# Altium footprint library 1.27插件排母.PcbLib: 33 footprints (part 1 of 3)
Each footprint in its own frame and in the unit in brackets; x right, y up, seen from the top. Pads: shape width x height; smd on the part's side, far side on the other; paste and mask are expansions set on the pad; w line width, h text height; cw(c..) or ccw(c..) is an arc to the next point about the centre after c.
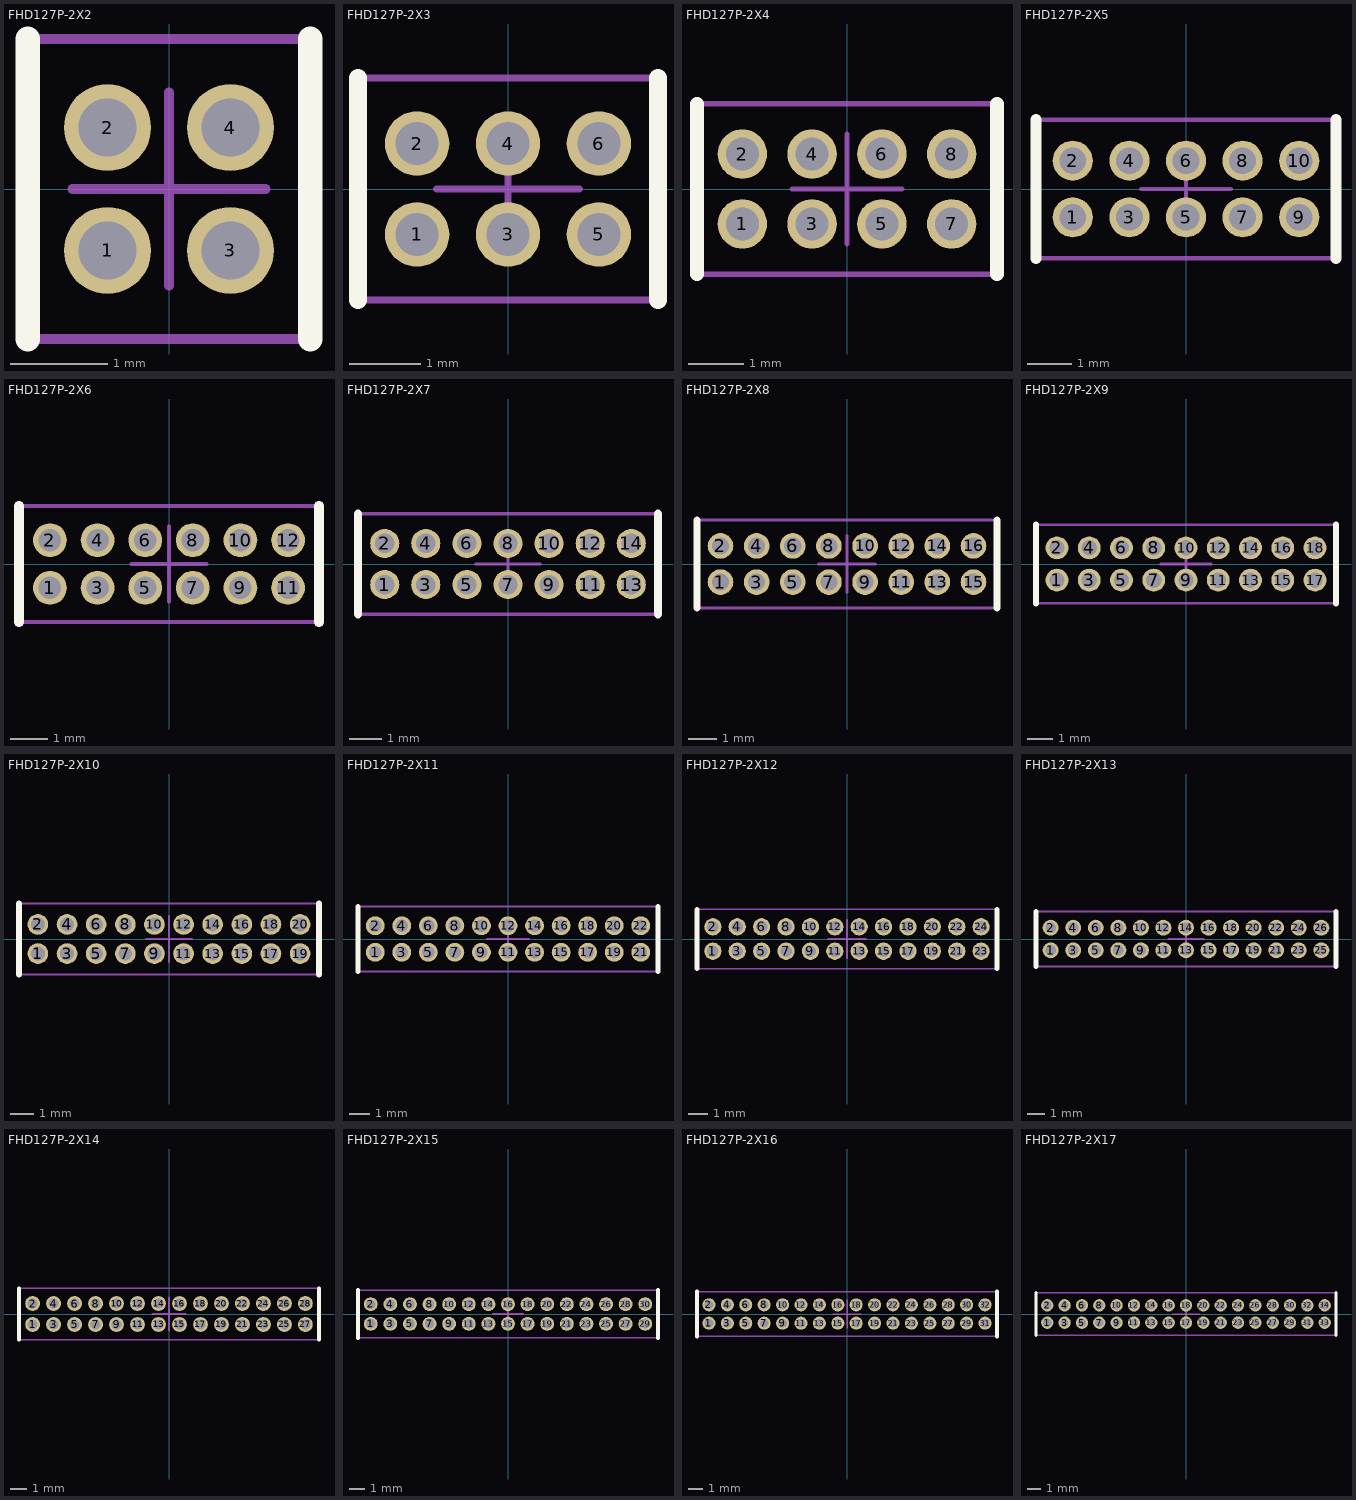
[diagram p0: the footprints below, top view; thin cyan lines are the x and y axes]

## FHD127P-2X2 [mm] "1.27mm脚距 插件 双排母"
height 3.4
pads (4):
  round 0.9 hole 0.6: 1(-0.635,-0.635) 2(-0.635,0.635) 3(0.635,-0.635) 4(0.635,0.635)
Top Overlay:
  lines w0.254: -1.46,-1.55 -1.46,1.55 ; 1.46,-1.55 1.46,1.55
Mechanical 13:
  lines w0.1: -1.46,-1.55 -1.46,1.55 1.46,1.55 1.46,-1.55 -1.46,-1.55
Mechanical 15:
  lines w0.1: -1,0 1,0 ; 0,-1 0,1
3D body: height 3.4, standoff -2.4, extent -1.46,-1.499 1.46,1.501

## FHD127P-2X3 [mm] "1.27mm脚距 插件 双排母"
height 3.4
pads (6):
  round 0.9 hole 0.6: 1(-1.27,-0.635) 2(-1.27,0.635) 3(0,-0.635) 4(0,0.635) 5(1.27,-0.635) 6(1.27,0.635)
Top Overlay:
  lines w0.254: -2.095,-1.55 -2.095,1.55 ; 2.095,-1.55 2.095,1.55
Mechanical 13:
  lines w0.1: -2.095,-1.55 -2.095,1.55 2.095,1.55 2.095,-1.55 -2.095,-1.55
Mechanical 15:
  lines w0.1: -1,0 1,0 ; 0,-1 0,1
3D body: height 3.4, standoff -2.4, extent -2.095,-1.499 2.095,1.501

## FHD127P-2X4 [mm] "1.27mm脚距 插件 双排母"
height 3.4
pads (8):
  round 0.9 hole 0.6: 1(-1.905,-0.635) 2(-1.905,0.635) 3(-0.635,-0.635) 4(-0.635,0.635) 5(0.635,-0.635) 6(0.635,0.635) 7(1.905,-0.635) 8(1.905,0.635)
Top Overlay:
  lines w0.254: -2.73,-1.55 -2.73,1.55 ; 2.73,-1.55 2.73,1.55
Mechanical 13:
  lines w0.1: -2.73,-1.55 -2.73,1.55 2.73,1.55 2.73,-1.55 -2.73,-1.55
Mechanical 15:
  lines w0.1: -1,0 1,0 ; 0,-1 0,1
3D body: height 3.4, standoff -2.4, extent -2.73,-1.499 2.73,1.501

## FHD127P-2X5 [mm] "1.27mm脚距 插件 双排母"
height 3.4
pads (10):
  round 0.9 hole 0.6: 1(-2.54,-0.635) 2(-2.54,0.635) 3(-1.27,-0.635) 4(-1.27,0.635) 5(0,-0.635) 6(0,0.635) 7(1.27,-0.635) 8(1.27,0.635) 9(2.54,-0.635) 10(2.54,0.635)
Top Overlay:
  lines w0.254: -3.365,-1.55 -3.365,1.55 ; 3.365,-1.55 3.365,1.55
Mechanical 13:
  lines w0.1: -3.365,-1.55 3.365,-1.55 3.365,1.55 -3.365,1.55 -3.365,-1.55
Mechanical 15:
  lines w0.1: -1,0 1,0 ; 0,-1 0,1
3D body: height 3.4, standoff -2.4, extent -3.365,-1.499 3.365,1.501

## FHD127P-2X6 [mm] "1.27mm脚距 插件 双排母"
height 3.4
pads (12):
  round 0.9 hole 0.6: 1(-3.175,-0.635) 2(-3.175,0.635) 3(-1.905,-0.635) 4(-1.905,0.635) 5(-0.635,-0.635) 6(-0.635,0.635) 7(0.635,-0.635) 8(0.635,0.635) 9(1.905,-0.635) 10(1.905,0.635) 11(3.175,-0.635) 12(3.175,0.635)
Top Overlay:
  lines w0.254: -4,-1.55 -4,1.55 ; 4,-1.55 4,1.55
Mechanical 13:
  lines w0.1: -4,-1.55 4,-1.55 4,1.55 -4,1.55 -4,-1.55
Mechanical 15:
  lines w0.1: -1,0 1,0 ; 0,-1 0,1
3D body: height 3.4, standoff -2.4, extent -4,-1.499 4,1.501

## FHD127P-2X7 [mm] "1.27mm脚距 插件 双排母"
height 3.4
pads (14):
  round 0.9 hole 0.6: 1(-3.81,-0.635) 2(-3.81,0.635) 3(-2.54,-0.635) 4(-2.54,0.635) 5(-1.27,-0.635) 6(-1.27,0.635) 7(0,-0.635) 8(0,0.635) 9(1.27,-0.635) 10(1.27,0.635) 11(2.54,-0.635) 12(2.54,0.635) 13(3.81,-0.635) 14(3.81,0.635)
Top Overlay:
  lines w0.254: -4.635,-1.55 -4.635,1.55 ; 4.635,-1.55 4.635,1.55
Mechanical 13:
  lines w0.1: -4.635,-1.55 -4.635,1.55 4.635,1.55 4.635,-1.55 -4.635,-1.55
Mechanical 15:
  lines w0.1: -1,0 1,0 ; 0,-1 0,1
3D body: height 3.4, standoff -2.4, extent -4.635,-1.499 4.635,1.501

## FHD127P-2X8 [mm] "1.27mm脚距 插件 双排母"
height 3.4
pads (16):
  round 0.9 hole 0.6: 1(-4.445,-0.635) 2(-4.445,0.635) 3(-3.175,-0.635) 4(-3.175,0.635) 5(-1.905,-0.635) 6(-1.905,0.635) 7(-0.635,-0.635) 8(-0.635,0.635) 9(0.635,-0.635) 10(0.635,0.635) 11(1.905,-0.635) 12(1.905,0.635) 13(3.175,-0.635) 14(3.175,0.635) 15(4.445,-0.635) 16(4.445,0.635)
Top Overlay:
  lines w0.254: -5.27,-1.55 -5.27,1.55 ; 5.27,-1.55 5.27,1.55
Mechanical 13:
  lines w0.1: -5.27,-1.55 5.27,-1.55 5.27,1.55 -5.27,1.55 -5.27,-1.55
Mechanical 15:
  lines w0.1: -1,0 1,0 ; 0,-1 0,1
3D body: height 3.4, standoff -2.4, extent -5.27,-1.499 5.27,1.501

## FHD127P-2X9 [mm] "1.27mm脚距 插件 双排母"
height 3.4
pads (18):
  round 0.9 hole 0.6: 1(-5.08,-0.635) 2(-5.08,0.635) 3(-3.81,-0.635) 4(-3.81,0.635) 5(-2.54,-0.635) 6(-2.54,0.635) 7(-1.27,-0.635) 8(-1.27,0.635) 9(0,-0.635) 10(0,0.635) 11(1.27,-0.635) 12(1.27,0.635) 13(2.54,-0.635) 14(2.54,0.635) 15(3.81,-0.635) 16(3.81,0.635) 17(5.08,-0.635) 18(5.08,0.635)
Top Overlay:
  lines w0.254: -5.905,-1.55 -5.905,1.55 ; 5.905,-1.55 5.905,1.55
Mechanical 13:
  lines w0.1: -5.905,-1.55 5.905,-1.55 5.905,1.55 -5.905,1.55 -5.905,-1.55
Mechanical 15:
  lines w0.1: -1,0 1,0 ; 0,-1 0,1
3D body: height 3.4, standoff -2.4, extent -5.905,-1.499 5.905,1.501

## FHD127P-2X10 [mm] "1.27mm脚距 插件 双排母"
height 3.4
pads (20):
  round 0.9 hole 0.6: 1(-5.715,-0.635) 2(-5.715,0.635) 3(-4.445,-0.635) 4(-4.445,0.635) 5(-3.175,-0.635) 6(-3.175,0.635) 7(-1.905,-0.635) 8(-1.905,0.635) 9(-0.635,-0.635) 10(-0.635,0.635) 11(0.635,-0.635) 12(0.635,0.635) 13(1.905,-0.635) 14(1.905,0.635) 15(3.175,-0.635) 16(3.175,0.635) 17(4.445,-0.635) 18(4.445,0.635) 19(5.715,-0.635) 20(5.715,0.635)
Top Overlay:
  lines w0.254: -6.54,-1.55 -6.54,1.55 ; 6.54,-1.55 6.54,1.55
Mechanical 13:
  lines w0.1: -6.54,-1.55 -6.54,1.55 6.54,1.55 6.54,-1.55 -6.54,-1.55
Mechanical 15:
  lines w0.1: -1,0 1,0 ; 0,-1 0,1
3D body: height 3.4, standoff -2.4, extent -6.54,-1.499 6.54,1.501

## FHD127P-2X11 [mm] "1.27mm脚距 插件 双排母"
height 3.4
pads (22):
  round 0.9 hole 0.6: 1(-6.35,-0.635) 2(-6.35,0.635) 3(-5.08,-0.635) 4(-5.08,0.635) 5(-3.81,-0.635) 6(-3.81,0.635) 7(-2.54,-0.635) 8(-2.54,0.635) 9(-1.27,-0.635) 10(-1.27,0.635) 11(0,-0.635) 12(0,0.635) 13(1.27,-0.635) 14(1.27,0.635) 15(2.54,-0.635) 16(2.54,0.635) 17(3.81,-0.635) 18(3.81,0.635) 19(5.08,-0.635) 20(5.08,0.635) 21(6.35,-0.635) 22(6.35,0.635)
Top Overlay:
  lines w0.254: -7.175,-1.55 -7.175,1.55 ; 7.175,-1.55 7.175,1.55
Mechanical 13:
  lines w0.1: -7.175,-1.55 7.175,-1.55 7.175,1.55 -7.175,1.55 -7.175,-1.55
Mechanical 15:
  lines w0.1: -1,0 1,0 ; 0,-1 0,1
3D body: height 3.4, standoff -2.4, extent -7.175,-1.499 7.175,1.501

## FHD127P-2X12 [mm] "1.27mm脚距 插件 双排母"
height 3.4
pads (24):
  round 0.9 hole 0.6: 1(-6.985,-0.635) 2(-6.985,0.635) 3(-5.715,-0.635) 4(-5.715,0.635) 5(-4.445,-0.635) 6(-4.445,0.635) 7(-3.175,-0.635) 8(-3.175,0.635) 9(-1.905,-0.635) 10(-1.905,0.635) 11(-0.635,-0.635) 12(-0.635,0.635) 13(0.635,-0.635) 14(0.635,0.635) 15(1.905,-0.635) 16(1.905,0.635) 17(3.175,-0.635) 18(3.175,0.635) 19(4.445,-0.635) 20(4.445,0.635) 21(5.715,-0.635) 22(5.715,0.635) 23(6.985,-0.635) 24(6.985,0.635)
Top Overlay:
  lines w0.254: -7.81,-1.55 -7.81,1.55 ; 7.81,-1.55 7.81,1.55
Mechanical 13:
  lines w0.1: -7.81,-1.55 7.81,-1.55 7.81,1.55 -7.81,1.55 -7.81,-1.55
Mechanical 15:
  lines w0.1: -1,0 1,0 ; 0,-1 0,1
3D body: height 3.4, standoff -2.4, extent -7.81,-1.499 7.81,1.501

## FHD127P-2X13 [mm] "1.27mm脚距 插件 双排母"
height 3.4
pads (26):
  round 0.9 hole 0.6: 1(-7.62,-0.635) 2(-7.62,0.635) 3(-6.35,-0.635) 4(-6.35,0.635) 5(-5.08,-0.635) 6(-5.08,0.635) 7(-3.81,-0.635) 8(-3.81,0.635) 9(-2.54,-0.635) 10(-2.54,0.635) 11(-1.27,-0.635) 12(-1.27,0.635) 13(0,-0.635) 14(0,0.635) 15(1.27,-0.635) 16(1.27,0.635) 17(2.54,-0.635) 18(2.54,0.635) 19(3.81,-0.635) 20(3.81,0.635) 21(5.08,-0.635) 22(5.08,0.635) 23(6.35,-0.635) 24(6.35,0.635) 25(7.62,-0.635) 26(7.62,0.635)
Top Overlay:
  lines w0.254: -8.445,-1.55 -8.445,1.55 ; 8.445,-1.55 8.445,1.55
Mechanical 13:
  lines w0.1: -8.445,-1.55 8.445,-1.55 8.445,1.55 -8.445,1.55 -8.445,-1.55
Mechanical 15:
  lines w0.1: -1,0 1,0 ; 0,-1 0,1
3D body: height 3.4, standoff -2.4, extent -8.445,-1.499 8.445,1.501

## FHD127P-2X14 [mm] "1.27mm脚距 插件 双排母"
height 3.4
pads (28):
  round 0.9 hole 0.6: 1(-8.255,-0.635) 2(-8.255,0.635) 3(-6.985,-0.635) 4(-6.985,0.635) 5(-5.715,-0.635) 6(-5.715,0.635) 7(-4.445,-0.635) 8(-4.445,0.635) 9(-3.175,-0.635) 10(-3.175,0.635) 11(-1.905,-0.635) 12(-1.905,0.635) 13(-0.635,-0.635) 14(-0.635,0.635) 15(0.635,-0.635) 16(0.635,0.635) 17(1.905,-0.635) 18(1.905,0.635) 19(3.175,-0.635) 20(3.175,0.635) 21(4.445,-0.635) 22(4.445,0.635) 23(5.715,-0.635) 24(5.715,0.635) 25(6.985,-0.635) 26(6.985,0.635) 27(8.255,-0.635) 28(8.255,0.635)
Top Overlay:
  lines w0.254: -9.08,-1.55 -9.08,1.55 ; 9.08,-1.55 9.08,1.55
Mechanical 13:
  lines w0.1: -9.08,-1.55 9.08,-1.55 9.08,1.55 -9.08,1.55 -9.08,-1.55
Mechanical 15:
  lines w0.1: -1,0 1,0 ; 0,-1 0,1
3D body: height 3.4, standoff -2.4, extent -9.08,-1.499 9.08,1.501

## FHD127P-2X15 [mm] "1.27mm脚距 插件 双排母"
height 3.4
pads (30):
  round 0.9 hole 0.6: 1(-8.89,-0.635) 2(-8.89,0.635) 3(-7.62,-0.635) 4(-7.62,0.635) 5(-6.35,-0.635) 6(-6.35,0.635) 7(-5.08,-0.635) 8(-5.08,0.635) 9(-3.81,-0.635) 10(-3.81,0.635) 11(-2.54,-0.635) 12(-2.54,0.635) 13(-1.27,-0.635) 14(-1.27,0.635) 15(0,-0.635) 16(0,0.635) 17(1.27,-0.635) 18(1.27,0.635) 19(2.54,-0.635) 20(2.54,0.635) 21(3.81,-0.635) 22(3.81,0.635) 23(5.08,-0.635) 24(5.08,0.635) 25(6.35,-0.635) 26(6.35,0.635) 27(7.62,-0.635) 28(7.62,0.635) 29(8.89,-0.635) 30(8.89,0.635)
Top Overlay:
  lines w0.254: -9.715,-1.55 -9.715,1.55 ; 9.715,-1.55 9.715,1.55
Mechanical 13:
  lines w0.1: -9.715,-1.55 9.715,-1.55 9.715,1.55 -9.715,1.55 -9.715,-1.55
Mechanical 15:
  lines w0.1: -1,0 1,0 ; 0,-1 0,1
3D body: height 3.4, standoff -2.4, extent -9.715,-1.499 9.715,1.501

## FHD127P-2X16 [mm] "1.27mm脚距 插件 双排母"
height 3.4
pads (32):
  round 0.9 hole 0.6: 1(-9.525,-0.635) 2(-9.525,0.635) 3(-8.255,-0.635) 4(-8.255,0.635) 5(-6.985,-0.635) 6(-6.985,0.635) 7(-5.715,-0.635) 8(-5.715,0.635) 9(-4.445,-0.635) 10(-4.445,0.635) 11(-3.175,-0.635) 12(-3.175,0.635) 13(-1.905,-0.635) 14(-1.905,0.635) 15(-0.635,-0.635) 16(-0.635,0.635) 17(0.635,-0.635) 18(0.635,0.635) 19(1.905,-0.635) 20(1.905,0.635) 21(3.175,-0.635) 22(3.175,0.635) 23(4.445,-0.635) 24(4.445,0.635) 25(5.715,-0.635) 26(5.715,0.635) 27(6.985,-0.635) 28(6.985,0.635) 29(8.255,-0.635) 30(8.255,0.635) 31(9.525,-0.635) 32(9.525,0.635)
Top Overlay:
  lines w0.254: -10.35,-1.55 -10.35,1.55 ; 10.35,-1.55 10.35,1.55
Mechanical 13:
  lines w0.1: -10.35,-1.55 10.35,-1.55 10.35,1.55 -10.35,1.55 -10.35,-1.55
Mechanical 15:
  lines w0.1: -1,0 1,0 ; 0,-1 0,1
3D body: height 3.4, standoff -2.4, extent -10.35,-1.499 10.35,1.501

## FHD127P-2X17 [mm] "1.27mm脚距 插件 双排母"
height 3.4
pads (34):
  round 0.9 hole 0.6: 1(-10.16,-0.635) 2(-10.16,0.635) 3(-8.89,-0.635) 4(-8.89,0.635) 5(-7.62,-0.635) 6(-7.62,0.635) 7(-6.35,-0.635) 8(-6.35,0.635) 9(-5.08,-0.635) 10(-5.08,0.635) 11(-3.81,-0.635) 12(-3.81,0.635) 13(-2.54,-0.635) 14(-2.54,0.635) 15(-1.27,-0.635) 16(-1.27,0.635) 17(0,-0.635) 18(0,0.635) 19(1.27,-0.635) 20(1.27,0.635) 21(2.54,-0.635) 22(2.54,0.635) 23(3.81,-0.635) 24(3.81,0.635) 25(5.08,-0.635) 26(5.08,0.635) 27(6.35,-0.635) 28(6.35,0.635) 29(7.62,-0.635) 30(7.62,0.635) 31(8.89,-0.635) 32(8.89,0.635) 33(10.16,-0.635) 34(10.16,0.635)
Top Overlay:
  lines w0.254: -10.985,-1.55 -10.985,1.55 ; 10.985,-1.55 10.985,1.55
Mechanical 13:
  lines w0.1: -10.985,-1.55 10.985,-1.55 10.985,1.55 -10.985,1.55 -10.985,-1.55
Mechanical 15:
  lines w0.1: -1,0 1,0 ; 0,-1 0,1
3D body: height 3.4, standoff -2.4, extent -10.985,-1.499 10.985,1.501